# Altium footprint library Discretes.PcbLib: 81 footprints (part 4 of 6)
Each footprint in its own frame and in the unit in brackets; x right, y up, seen from the top. Pads: shape width x height; smd on the part's side, far side on the other; paste and mask are expansions set on the pad; w line width, h text height; cw(c..) or ccw(c..) is an arc to the next point about the centre after c.
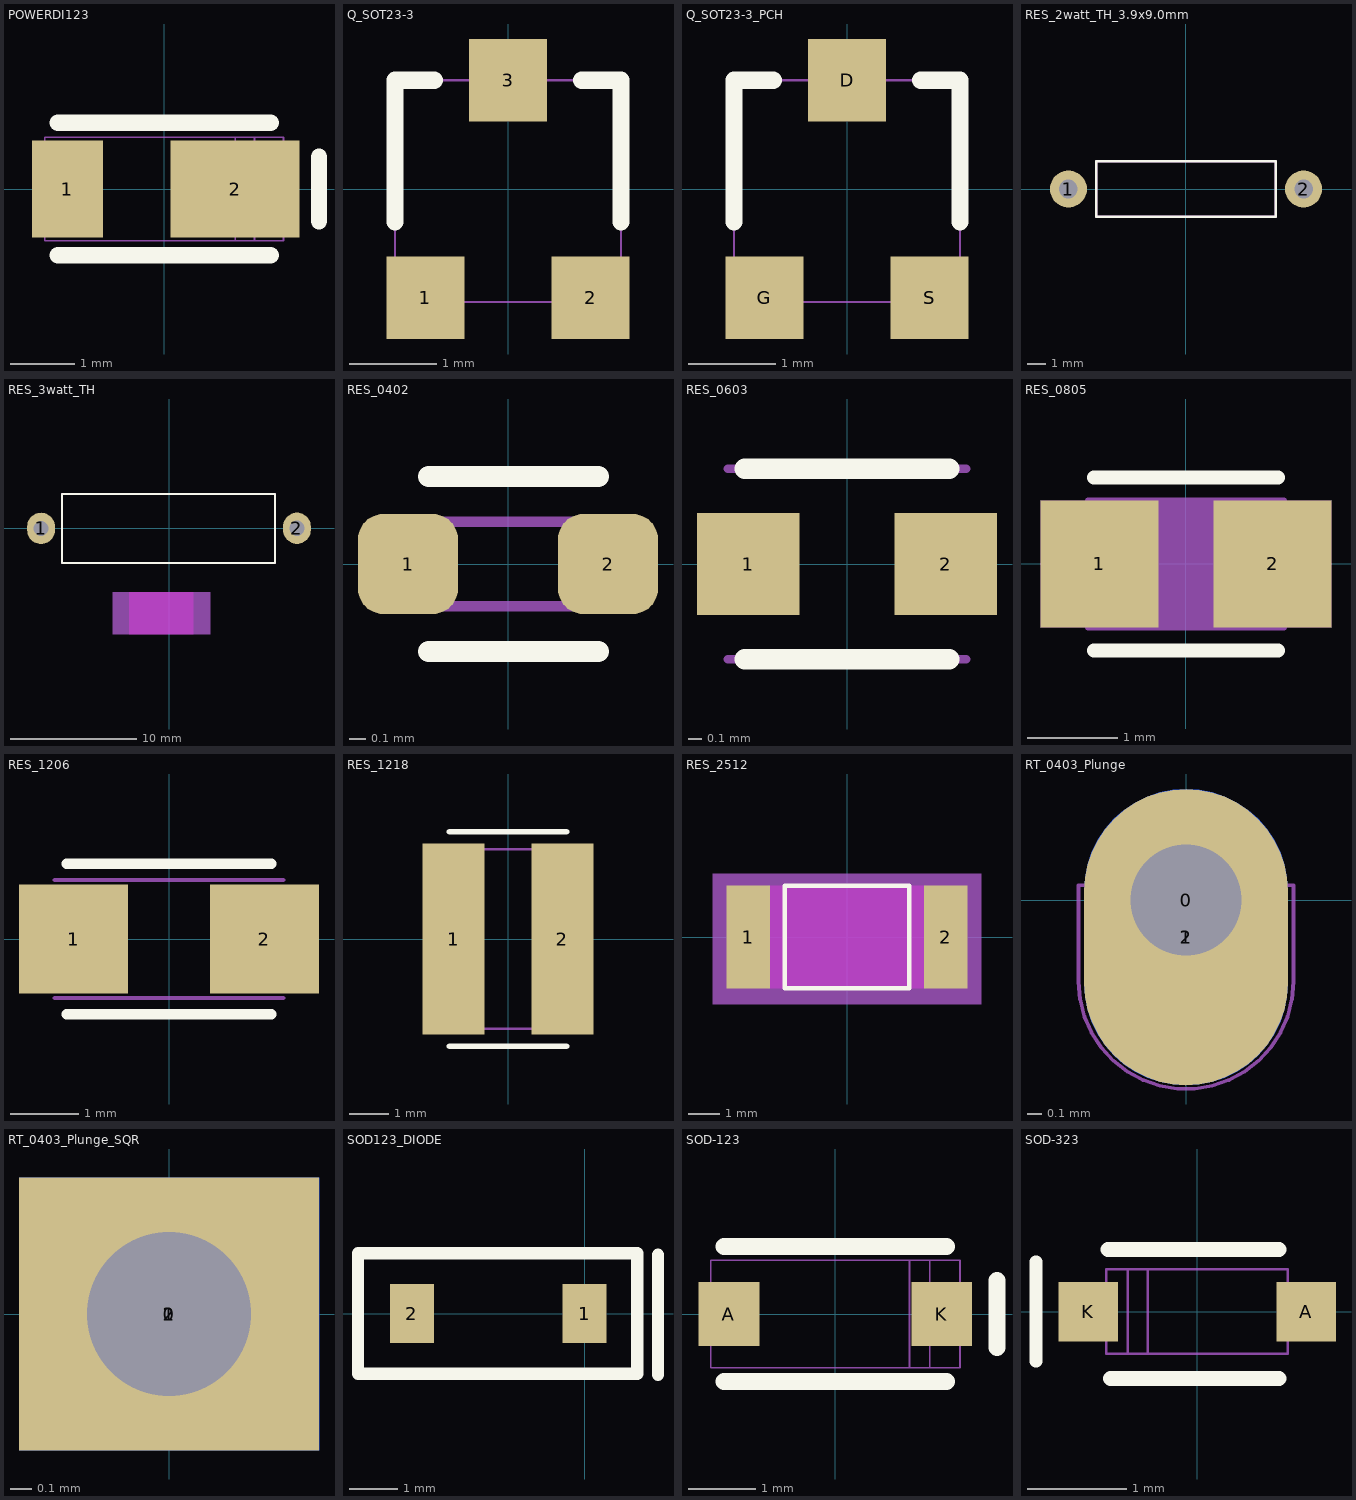
[diagram p3: the footprints below, top view; thin cyan lines are the x and y axes]

## POWERDI123 [mm] "Power DI 123 package from Diodes"
height 1
pads (2):
  rect 1.1x1.5 smd: 1(-1.5,0)
  rect 2x1.5 smd: 2(1.1,0)
Top Overlay:
  lines w0.254: -1.65,-1.025 1.65,-1.025 ; -1.65,1.025 1.65,1.025 ; 2.4,-0.5 2.4,0.5
Mechanical 1:
  lines w0.025: 1.1,-0.8 1.1,0.8 ; 1.4,-0.8 1.4,0.8 ; -1.85,-0.8 -1.85,0.8 1.85,0.8 1.85,-0.8 -1.85,-0.8
  text ".Designator" at -0.6,1.25 h0.76
3D body "POWERDI-123.STEP": height 1, standoff 0, extent -1.95,-0.965 1.95,0.965

## Q_SOT23-3 [mm] "SOT23, 3-Leads, Body 3.016x2.8mm, Pitch 0.95mm"
pads (3):
  rect 0.9x0.95 smd: 1(-0.95,-1.25) 2(0.95,-1.25) 3(0,1.25)
Top Overlay:
  lines w0.2: -1.3,-0.375 -1.3,1.25 -0.85,1.25 ; 0.85,1.25 1.3,1.25 1.3,-0.375
Mechanical 1:
  region: 1.225,-1.275 0.625,-1.275 0.625,-1.525 1.225,-1.525
  region: -0.625,-1.275 -1.225,-1.275 -1.225,-1.525 -0.625,-1.525
  rectangle: -0.3,1.25 0.3,1.5
  lines w0.025: -1.3,-1.3 1.3,-1.3 1.3,1.25 -1.3,1.25 -1.3,-1.3
  text ".Designator" at -0.9,2 h1
3D body: height 1.1, standoff 0, extent -1.142,-0.543 1.171,0.651
3D body: height 0.13, standoff 0, extent -1.115,-1.254 -0.608,-0.543
3D body: height 0.13, standoff 0, extent 0.663,-1.254 1.17,-0.543
3D body: height 0.13, standoff 0, extent -0.239,0.651 0.268,1.362

## Q_SOT23-3_PCH [mm] "SOT23, 3-Leads, Body 3.016x2.8mm, Pitch 0.95mm"
pads (3):
  rect 0.9x0.95 smd: D(0,1.25) G(-0.95,-1.25) S(0.95,-1.25)
Top Overlay:
  lines w0.2: -1.3,-0.375 -1.3,1.25 -0.85,1.25 ; 0.85,1.25 1.3,1.25 1.3,-0.375
Mechanical 1:
  region: 1.225,-1.275 0.625,-1.275 0.625,-1.525 1.225,-1.525
  region: -0.625,-1.275 -1.225,-1.275 -1.225,-1.525 -0.625,-1.525
  rectangle: -0.3,1.25 0.3,1.5
  lines w0.025: -1.3,-1.3 1.3,-1.3 1.3,1.25 -1.3,1.25 -1.3,-1.3
  text ".Designator" at -0.9,2 h1
3D body: height 1.1, standoff 0, extent -1.142,-0.543 1.171,0.651
3D body: height 0.13, standoff 0, extent -1.115,-1.254 -0.608,-0.543
3D body: height 0.13, standoff 0, extent 0.663,-1.254 1.17,-0.543
3D body: height 0.13, standoff 0, extent -0.239,0.651 0.268,1.362

## RES_2watt_TH_3.9x9.0mm [mm] "Resistor 2watt, 3.9x9.0mm"
height 3.9
pads (2):
  rrect100% 2x2 hole 1: 1(-6.35,0) 2(6.35,0)
Top Overlay:
  lines w0.152: -4.85,-1.5 -4.85,1.5 4.85,1.5 4.85,-1.5 -4.85,-1.5
Mechanical 1:
  lines w0.152: -4.85,-1.5 4.85,-1.5 4.85,1.5 -4.85,1.5 -4.85,-1.5
3D body "RES-1_5W.STEP": height 3.5, standoff -3, extent -6.62,-1.75 6.62,1.75

## RES_3watt_TH [mm] "Resistor 3watt, 15-16mm x 5mm"
pads (2):
  rrect100% 2.2x2.5 hole 1.2: 1(-10.16,-0.005) 2(10.16,0.005)
Top Overlay:
  lines w0.152: -8.5,-2.77 -8.5,2.73 8.4,2.73 8.4,-2.77 -8.5,-2.77
Mechanical 1:
  lines w0.152: -8.5,-2.77 8.4,-2.77 8.4,2.73 -8.5,2.73 -8.5,-2.77
  text ".Designator" at -3.1,-0.77 h1.27
Mechanical 11:
  pour cut-out: 2.829,-8.396 3.261,-8.396 3.261,-5.094 2.829,-5.094 -4.283,-5.094 -4.461,-5.094 -4.461,-5.602 -4.461,-7.939 -4.461,-8.396 -4.41,-8.396
Mechanical 29 keep-out:
  region: -3.013,-8.396 1.813,-8.396 1.813,-5.094 -3.013,-5.094
  region: 1.94,-5.094 -3.14,-5.094 -3.14,-8.396 1.94,-8.396
3D body "RES-2W.STEP": height 5.5, standoff -3, extent -10.51,-2.745 10.51,2.755

## RES_0402 [mm] "Resistor 0402 Package"
height 0.559
pads (2):
  rrect50% 0.6x0.6 smd: 1(-0.6,0) 2(0.6,0)
Top Overlay:
  lines w0.127: -0.475,-0.525 0.541,-0.525 ; -0.475,0.525 0.541,0.525
Mechanical 1:
  lines w0.064: -0.508,-0.254 0.508,-0.254 ; -0.508,0.254 0.508,0.254
  text ".Designator" at -0.457,-0.203 h0.38
3D body "res0402.STEP": height 0.41, standoff 0, extent -0.575,-0.275 0.575,0.275

## RES_0603 [mil] "Resistor 0603 package"
height 24
pads (2):
  rect 30x30 smd: 1(-29,0) 2(29,0)
Top Overlay:
  lines w6: -30,-28 30,-28 ; -30,28 30,28
Mechanical 1:
  lines w2.5: -35,-27.87 35,-27.87 ; -35,27.87 35,27.87
  text ".Designator" at -19.68,-19.68 h39.37
3D body "res0603-1.step": height 15.75, standoff 0, extent -31.49,-15.74 31.5,15.75

## RES_0805 [mil] "Resistor 0805 package"
height 27.56
pads (2):
  rect 51x55 smd: 1(-37.5,0) 2(37.5,0)
Top Overlay:
  lines w6: -40,-37.5 40,-37.5 ; -40,37.5 40,37.5
Mechanical 1:
  lines w2.5: -42.5,-27.5 42.5,-27.5 ; -42.5,27.5 42.5,27.5
  text ".Designator" at -23.62,-15.75 h31
Mechanical 11:
  pour cut-out: -63,-27.5 63,-27.5 63,27.5 -63,27.5
3D body "RES_2013-0805.step": height 29.92, standoff 0, extent -45.27,-26.57 45.28,26.58

## RES_1206 [mm] "Resistor 1206 package"
height 0.5
pads (2):
  rect 1.6x1.6 smd: 1(-1.397,0) 2(1.397,0)
Top Overlay:
  lines w0.152: -1.5,-1.1 1.5,-1.1 ; -1.5,1.1 1.5,1.1
Mechanical 1:
  lines w0.064: -1.675,-0.865 1.675,-0.865 ; -1.675,0.865 1.675,0.865
  text ".Designator" at -0.6,-0.4 h0.79
3D body "RES_3216-1206.step": height 0.85, standoff 0, extent -1.675,-0.865 1.675,0.865

## RES_1218 [mm] "Resistor 1218 package"
height 0.5
pads (2):
  rect 1.6x4.9 smd: 1(-1.397,0) 2(1.397,0)
Top Overlay:
  lines w0.152: -1.5,-2.75 1.5,-2.75 ; -1.5,2.75 1.5,2.75
Mechanical 1:
  lines w0.064: -1.6,-2.305 1.6,-2.305 ; -1.6,2.305 1.6,2.305
  text ".Designator" at -0.6,-0.4 h0.79
3D body "1218.step": height 0.28, standoff -0.28, extent -1.6,-2.305 1.6,2.305

## RES_2512 [mil] "Resistor 2512 package"
height 28
pads (2):
  rect 55x130 smd: 1(-125,0) 2(125,0)
Top Overlay:
  lines w6: -78.74,-65 -78.74,65 78.74,65 78.74,-65 -78.74,-65
Mechanical 1:
  lines w2.5: -130,-65 130,-65 130,65 -130,65 -130,-65
  text ".Designator" at -55,-25 h50
Mechanical 11:
  pour cut-out: 135,-65 152,-65 152,65 135,65 -145,65 -152,65 -152,45 -152,-47 -152,-65 -150,-65
Mechanical 13:
  pour cut-out: -170,80 170,80 170,-85 -170,-85
Mechanical 29 keep-out:
  region: 100,65 -100,65 -100,-65 100,-65
  region: -95,-65 95,-65 95,65 -95,65
3D body "res2512_body.step": height 24.44, standoff 0, extent -124.39,-63 124.4,63

## RT_0403_Plunge [mil] "Thermistor 0402 Plunged into PCB"
height 19.68
pads (3):
  round 30 hole 30 unplated paste-30 mask-30: 0(0,0)
  oval 55x80 smd paste-60 mask-60: 1(0,-10)
  oval 55x80 smd far side paste-60 mask-60: 2(0,-10)
Top Paste:
  region: -27,-22 -27,2 27,2 27,-22 27,-25.55 25.16,-32.42 21.61,-38.58 16.58,-43.61 10.42,-47.16 3.55,-49 -3.55,-49 -10.42,-47.16 -16.58,-43.61 -21.61,-38.58 -25.16,-32.42 -27,-25.55
  lines w1: -27,-22 ccw(c0,-22) 27,-22 27,2 -27,2 -27,-22
Bottom Paste:
  region: -27,-22 -27,2 27,2 27,-22 27,-25.55 25.16,-32.42 21.61,-38.58 16.58,-43.61 10.42,-47.16 3.55,-49 -3.55,-49 -10.42,-47.16 -16.58,-43.61 -21.61,-38.58 -25.16,-32.42 -27,-25.55
Top Solder:
  region: -29,-22 -29,-25.82 -27.02,-33.19 -23.21,-39.81 -17.81,-45.21 -11.19,-49.02 -3.82,-51 3.82,-51 11.19,-49.02 17.81,-45.21 23.21,-39.81 27.02,-33.19 29,-25.82 29,-22 29,4 17,4 16.32,6.87 13.16,11.86 8.53,15.52 2.95,17.46 -2.95,17.46 -8.53,15.52 -13.16,11.86 -16.32,6.87 -17,4 -29,4
Bottom Solder:
  region: -29,-22 -29,-25.82 -27.02,-33.19 -23.21,-39.81 -17.81,-45.21 -11.19,-49.02 -3.82,-51 3.82,-51 11.19,-49.02 17.81,-45.21 23.21,-39.81 27.02,-33.19 29,-25.82 29,-22 29,4 17,4 16.32,6.87 13.16,11.86 8.53,15.52 2.95,17.46 -2.95,17.46 -8.53,15.52 -13.16,11.86 -16.32,6.87 -17,4 -29,4
Mechanical 1:
  text ".Designator" at 33,0 h31
Mechanical 3:
  lines w1: -29,-22 ccw(c0,-22) 29,-22 29,4 17,4 ccw(c0,0) -17,4 -29,4 -29,-22 ; -27,-22 ccw(c0,-22) 27,-22 27,2 -27,2 -27,-22
3D body "res0402.STEP": height 2.64, standoff -42.64, extent -9.82,-10 11.83,6.14

## RT_0403_Plunge_SQR [mil] "Thermistor 0402 Plunged into PCB SQR Pad"
height 19.68
pads (3):
  round 30 hole 30 unplated paste-30: 0(0,0)
  rect 55x50 smd paste-55 mask+2: 1(0,0)
  rect 55x50 smd far side paste-55 mask+2: 2(0,0)
Top Paste:
  rectangle: -27,-24 27,1
Bottom Paste:
  rectangle: -27,-24 27,1
Mechanical 1:
  text ".Designator" at 33,0 h31
3D body "res0402.STEP": height 2.64, standoff -42.64, extent -9.82,-10 11.83,6.14

## SOD123_DIODE [mm]
pads (2):
  rect 0.91x1.22 smd: 1(0,0) 2(-3.58,0)
Top Overlay:
  lines w0.254: 1.524,-1.27 1.524,1.219 ; -4.698,-1.25 -4.698,1.25 1.094,1.25 1.094,-1.25 -4.698,-1.25
Mechanical 1:
  text ".Designator" at -4.303,-0.517 h1.02
3D body "SOD-123FL.STEP": height 1.35, standoff 0, extent -3.678,-1.061 0.172,1.092

## SOD-123 [mm] "SOD-123 Package for diodes"
height 1
pads (2):
  rect 0.9x0.95 smd: A(-1.58,0) K(1.58,0)
Top Overlay:
  lines w0.254: -1.65,-1 1.65,-1 ; -1.65,1 1.65,1 ; 2.4,-0.5 2.4,0.5
Mechanical 1:
  lines w0.025: 1.1,-0.8 1.1,0.8 ; 1.4,-0.8 1.4,0.8 ; -1.85,-0.8 -1.85,0.8 1.85,0.8 1.85,-0.8 -1.85,-0.8
  text ".Designator" at -0.8,-0.3 h0.76
3D body "SOD123.step": height 1.27, standoff 0, extent -1.85,-0.8 1.85,0.8

## SOD-323 [mm] "SOD-323 Package for diodes"
height 0.7
pads (2):
  rect 0.6x0.6 smd: A(1.1,0) K(-1.1,0)
Top Overlay:
  lines w0.127: -1.625,-0.5 -1.625,0.5
  lines w0.152: -0.9,0.625 0.824,0.625 ; -0.875,-0.675 0.824,-0.675
Mechanical 1:
  lines w0.025: -0.7,-0.424 -0.7,0.425 ; -0.5,-0.424 -0.5,0.425 ; -0.915,-0.424 0.915,-0.424 0.915,0.425 -0.915,0.425 -0.915,-0.424
  text ".Designator" at -0.4,-0.325 h0.64
3D body "SOD323.step": height 0.99, standoff 0, extent -1.25,-0.625 1.25,0.625